# Altium footprint library Global Library.PcbLib: 82 footprints (part 2 of 6)
Each footprint in its own frame and in the unit in brackets; x right, y up, seen from the top. Pads: shape width x height; smd on the part's side, far side on the other; paste and mask are expansions set on the pad; w line width, h text height; cw(c..) or ccw(c..) is an arc to the next point about the centre after c.
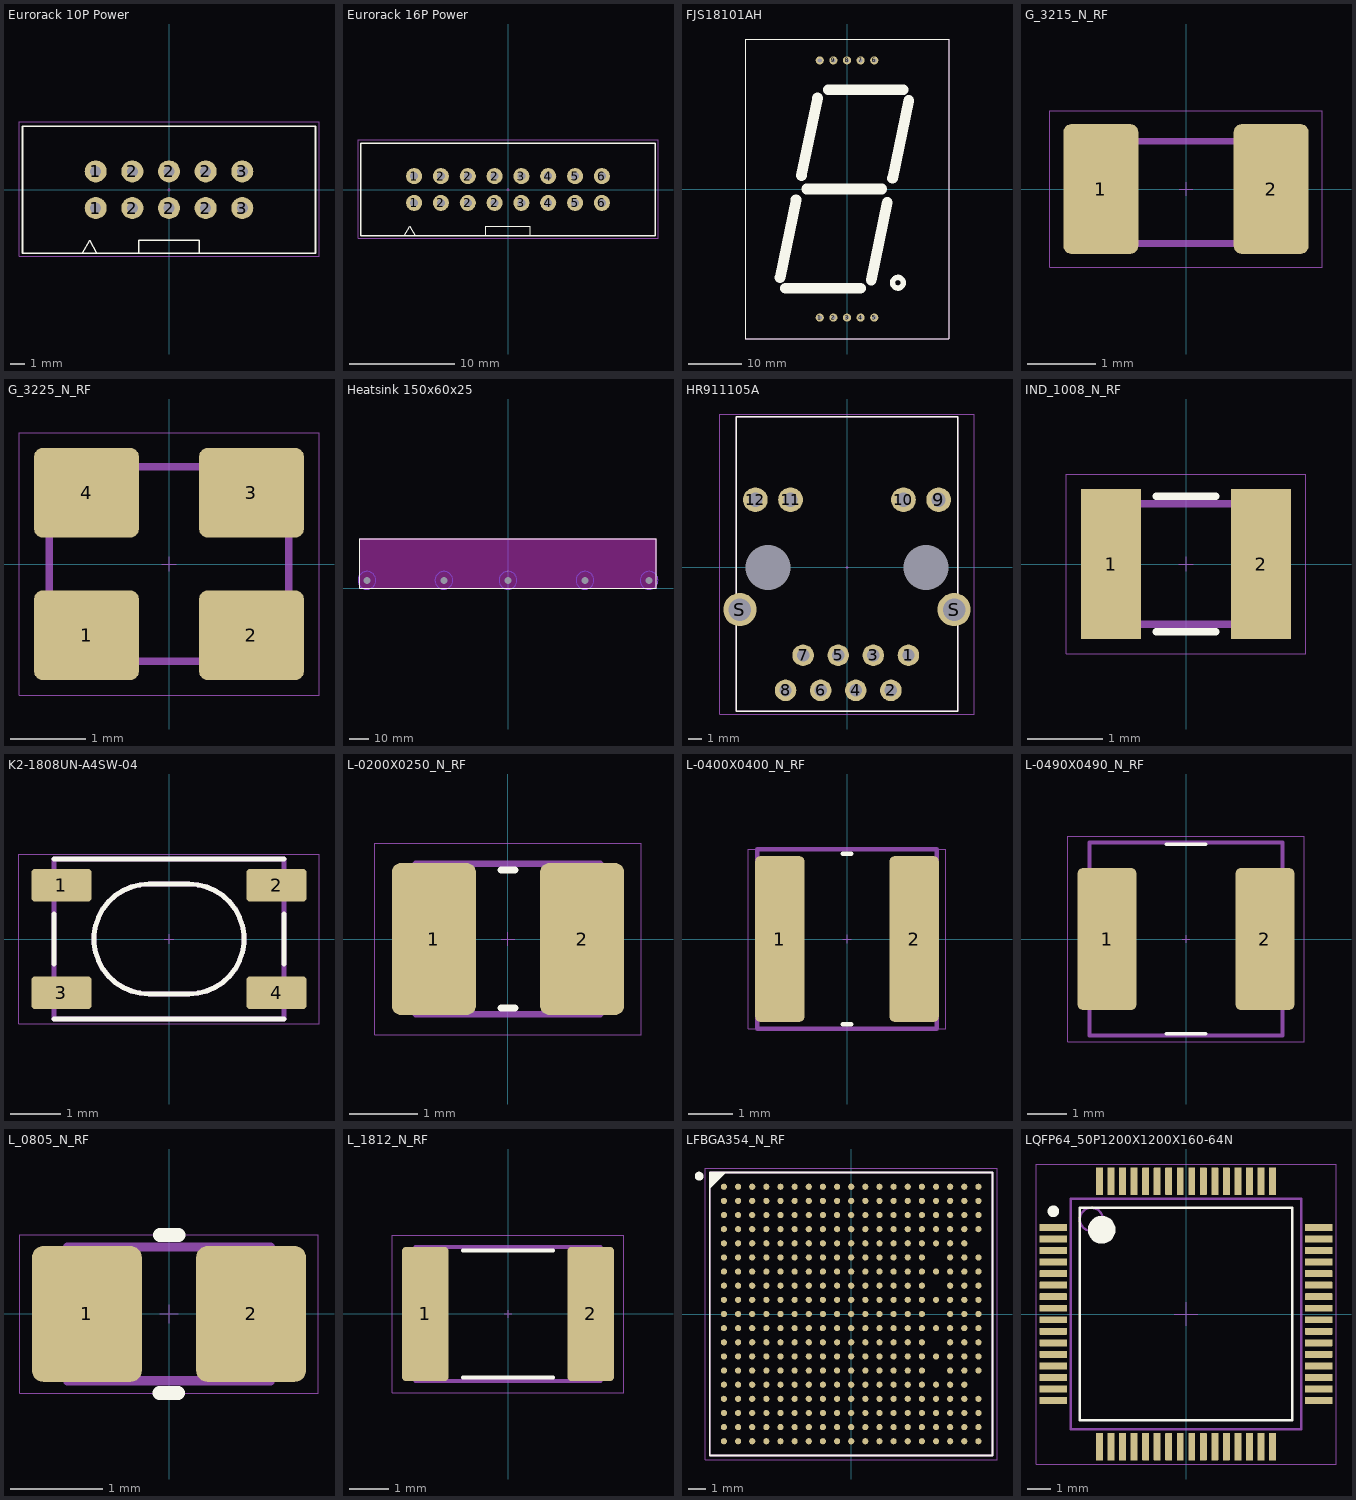
[diagram p1: the footprints below, top view; thin cyan lines are the x and y axes]

## Eurorack 10P Power [mil]
pads (10):
  round 60 hole 30: 1(-200,-50) 1(-200,50) 2(-100,-50) 2(-100,50) 2(0,-50) 2(0,50) 2(100,-50) 2(100,50) 3(200,-50) 3(200,50)
Top Overlay:
  lines w3.94: -236.22,-173.23 -216.54,-137.8 -196.85,-173.23 ; -82.3,-173.23 -82.3,-137.8 0,-137.8 82.3,-137.8 82.3,-173.23
  lines w5: -399.61,-173.23 -399.61,173.23 399.61,173.23 399.61,-173.23 -399.61,-173.23
Top Courtyard:
  lines w0.39: -3.94,0 3.94,0 ; 0,-3.94 0,3.94 ; -409.45,-181.1 -409.45,185.04 409.45,185.04 409.45,-181.1 -409.45,-181.1
Top Assy THT:
  text ".Designator" at -397.64,204.72 h39.37
3D body "User Library-DS1013-10S (IDC-10MS CONNFLY).step": height 354.33, standoff -141.73, extent -403.54,-177.17 403.54,173.23

## Eurorack 16P Power [mil]
pads (16):
  round 60 hole 30: 1(-350,-50) 1(-350,50) 2(-250,-50) 2(-250,50) 2(-150,-50) 2(-150,50) 2(-50,-50) 2(-50,50) 3(50,-50) 3(50,50) 4(150,-50) 4(150,50) 5(250,-50) 5(250,50) 6(350,-50) 6(350,50)
Top Overlay:
  lines w3.94: -386.22,-173.23 -366.54,-137.8 -346.85,-173.23 ; -82.3,-173.23 -82.3,-137.8 0,-137.8 82.3,-137.8 82.3,-173.23
  lines w5: -549.61,-173.23 -549.61,173.23 549.61,173.23 549.61,-173.23 -549.61,-173.23
Top Courtyard:
  lines w0.39: -3.94,0 3.94,0 ; 0,-3.94 0,3.94 ; -559.45,-181.1 -559.45,185.04 559.45,185.04 559.45,-181.1 -559.45,-181.1
Top Assy THT:
  text ".Designator" at -397.64,204.72 h39.37
3D body "30316-6002.stp": height 350, standoff -125, extent -549.21,-166.96 549.79,179.93

## FJS18101AH [mil]
pads (10):
  round 60 hole 30: 1(-200,-944.88) 2(-100,-944.88) 3(0,-944.88) 4(100,-944.88) 5(200,-944.88) 6(200,944.88) 7(100,944.88) 8(0,944.88) 9(-100,944.88) 10(-200,944.88)
Top Overlay:
  circle w39.37: c374.02,-688.98 r39.37
  lines w3.94: -748.03,-1102.36 -748.03,1102.36 748.03,1102.36 748.03,-1102.36 -748.03,-1102.36
  lines w78.74: -492.13,-649.61 -374.02,-78.74 ; -452.76,-728.35 98.43,-728.35 ; -334.65,98.43 -216.54,669.29 ; -295.28,0 255.91,0 ; -137.8,728.35 413.39,728.35 ; 177.17,-669.29 295.28,-98.43 ; 334.65,78.74 452.76,649.61
Top Courtyard:
  lines w0.39: -3.94,0 3.94,0 ; 0,-3.94 0,3.94 ; -748.03,-1102.36 -748.03,1102.36 748.03,1102.36 748.03,-1102.36 -748.03,-1102.36
Top Assembly:
  lines w3.94: -748.03,-1102.36 748.03,-1102.36 748.03,1102.36 -748.03,1102.36 -748.03,-1102.36
Top Assy SMT:
  lines w3.94: -748.03,-1102.36 748.03,-1102.36 748.03,1102.36 -748.03,1102.36 -748.03,-1102.36
Top Assy THT:
  text ".Designator" at -607.97,1018.85 h78.74

## G_3215_N_RF [mm] "Quarz Oscillator 2pin 3.2mm x 1.5mm"
height 0.8
pads (2):
  rrect20% 1.1x1.9 smd: 1(-1.25,0) 2(1.25,0)
Top Courtyard:
  lines w0.01: -0.1,0 0.1,0 ; 0,-0.1 0,0.1 ; -2,-1.15 -2,1.15 2,1.15 2,-1.15 -2,-1.15
Top Assembly:
  lines w0.1: -1.6,-0.8 1.6,-0.8 1.6,0.7 -1.6,0.7 -1.6,-0.8
Top Assy SMT:
  lines w0.1: -1.6,-0.8 1.6,-0.8 1.6,0.7 -1.6,0.7 -1.6,-0.8
  text ".Designator" at -2,1.3 h1
3D body "User Library-IL3X.step": height 0.9, standoff -0.01, extent -1.583,-0.757 1.617,0.743

## G_3225_N_RF [mm] "Crystal Oscillator  2.5mm X 3.2mm"
height 0.7
pads (4):
  rrect20% 1.4x1.2 smd: 1(-1.1,-0.95) 2(1.1,-0.95) 3(1.1,0.95) 4(-1.1,0.95)
Top Courtyard:
  lines w0.01: -0.1,0 0.1,0 ; 0,-0.1 0,0.1 ; -2,-1.75 -2,1.75 2,1.75 2,-1.75 -2,-1.75
Top Assembly:
  lines w0.1: -1.6,-1.3 1.6,-1.3 1.6,1.3 -1.6,1.3 -1.6,-1.3
Top Assy SMT:
  lines w0.1: -1.6,-1.3 1.6,-1.3 1.6,1.3 -1.6,1.3 -1.6,-1.3
  text ".Designator" at -1.7,1.8 h1
3D body "NX3225SA v2.step": height 0.55, standoff 0, extent -1.6,-1.25 1.6,1.25

## Heatsink 150x60x25 [mm]
pads (5):
  round 0 hole 3.5 unplated: 1(-71.261,4) 1(-32.391,4) 1(0,4) 1(38.87,4) 1(71.261,4)
Top Layer keep-out:
  region: -75,25 -75,0 75,0 75,25
Bottom Layer keep-out:
  circle w0.1: c71.261,4 r4.5
  circle w0.1: c38.87,4 r4.5
  circle w0.1: c-71.261,4 r4.5
  circle w0.1: c-32.391,4 r4.5
  circle w0.1: c0,4 r4.5
Top Overlay:
  lines w0.1: -75,0 75,0 75,25 -75,25 -75,0
Top Assembly:
  lines w0.1: -75,0 -75,25 75,25 75,0 -75,0
3D body "Kühlkörper.stp": height 60, standoff 0, extent -75,0 75,25

## HR911105A [mm] "Connector Ethernet 10/100Base-T"
pads (16):
  round 1.558 hole 0.89: 1(4.445,-6.35) 2(3.175,-8.89) 3(1.905,-6.35) 4(0.635,-8.89) 5(-0.635,-6.35) 6(-1.905,-8.89) 7(-3.175,-6.35) 8(-4.445,-8.89)
  round 1.785 hole 1.02: 9(6.625,4.9) 10(4.085,4.9) 11(-4.085,4.9) 12(-6.625,4.9)
  round 0 hole 3.25 unplated: 13(5.715,0) 14(-5.715,0)
  round 2.4 hole 1.63: S(-7.745,-3.05) S(7.745,-3.05)
Top Overlay:
  lines w0.1: -8,-10.4 8,-10.4 8,10.9 -8,10.9 -8,-10.4
Top Courtyard:
  lines w0.01: -0.1,0 0.1,0 ; 0,-0.1 0,0.1 ; -9.2,-10.6 9.2,-10.6 9.2,11.1 -9.2,11.1 -9.2,-10.6
Top Assy SMT:
  lines w0.1: -8,-10.4 -8,10.9 8,10.9 8,-10.4 -8,-10.4
Top Assy THT:
  text ".Designator" at 3.3,-11.3 h1
3D body "HR911105A--3DModel-STEP-56544.STEP": height 13.5, standoff -3.05, extent -8.02,-10.4 8.02,10.9

## IND_1008_N_RF [mm] "Inductor 2.5mmx2mm"
height 1.2
pads (2):
  rect 0.8x2 smd: 1(-1,0) 2(1,0)
Top Overlay:
  lines w0.1: -0.4,-0.9 0.4,-0.9 ; -0.4,0.9 0.4,0.9
Top Courtyard:
  lines w0.01: -0.1,0 0.1,0 ; 0,-0.1 0,0.1 ; -1.6,-1.2 1.6,-1.2 1.6,1.2 -1.6,1.2 -1.6,-1.2
Top Assembly:
  lines w0.1: -1.3,-0.8 -1.3,0.8 1.3,0.8 1.3,-0.8 -1.3,-0.8
Top Assy SMT:
  lines w0.1: -1.3,-0.8 1.3,-0.8 1.3,0.8 -1.3,0.8 -1.3,-0.8
  text ".Designator" at -1.7,1.4 h0.8
3D body "DFE252012P-R47M=P2.STEP": height 1.2, standoff 0, extent -1.25,-1 1.25,1

## K2-1808UN-A4SW-04 [mm]
pads (4):
  rrect20% 1.2x0.65 smd: 1(-2.15,1.075) 2(2.15,1.075) 3(-2.15,-1.075) 4(2.15,-1.075)
Top Overlay:
  lines w0.1: -2.3,-1.6 2.3,-1.6 ; -2.3,-0.5 -2.3,0.5 ; -2.3,1.6 2.3,1.6 ; 2.3,-0.5 2.3,0.5 ; -0.4,-1.1 cw(c-0.4,0) -0.4,1.1 0.4,1.1 cw(c0.4,0) 0.4,-1.1 -0.4,-1.1
Top Courtyard:
  lines w0.01: -0.1,0 0.1,0 ; 0,-0.1 0,0.1 ; -3,-1.7 -3,1.7 3,1.7 3,-1.7 -3,-1.7
Top Assembly:
  lines w0.1: -2.3,-1.6 -2.3,1.6 2.3,1.6 2.3,-1.6 -2.3,-1.6 ; -0.4,-1.1 cw(c-0.4,0) -0.4,1.1 0.4,1.1 cw(c0.4,0) 0.4,-1.1 -0.4,-1.1
Top Assy SMT:
  lines w0.1: -2.3,-1.6 -2.3,1.6 2.3,1.6 2.3,-1.6 -2.3,-1.6 ; -0.4,-1.1 cw(c-0.4,0) -0.4,1.1 0.4,1.1 cw(c0.4,0) 0.4,-1.1 -0.4,-1.1
  text ".Designator" at -2.3,1.8 h0.8
3D body "buttonK2-1808UN-A4SW-04.step": height 2.5, standoff 0, extent -2.35,-1.65 2.35,1.65

## L-0200X0250_N_RF [mm] "Chip Inductor, 2-Leads, Body 2.50x2.00mm, IPC Medium Density"
height 1.2
pads (2):
  rrect20% 1.23x2.22 smd: 1(-1.085,0) 2(1.085,0)
Top Overlay:
  lines w0.1: -0.1,-1.01 0.1,-1.01 ; -0.1,1.01 0.1,1.01
Top Courtyard:
  lines w0.01: -0.1,0 0.1,0 ; 0,-0.1 0,0.1 ; -1.95,-1.4 1.95,-1.4 1.95,1.4 -1.95,1.4 -1.95,-1.4
Top Assembly:
  lines w0.1: -1.35,-1.1 1.35,-1.1 1.35,1.1 -1.35,1.1 -1.35,-1.1
Top Assy SMT:
  lines w0.1: -1.35,-1.1 -1.35,1.1 1.35,1.1 1.35,-1.1 -1.35,-1.1
  text ".Designator" at -1.323,1.19 h1.2
3D body "L-0200X0250_N_RF.step": height 1.2, standoff 0, extent -1.35,-1.1 1.35,1.1

## L-0400X0400_N_RF [mm] "Chip Inductor, 2-Leads, Body 4.00x4.00mm, IPC Medium Density"
height 3
pads (2):
  rrect20% 1.1x3.7 smd: 1(-1.5,0) 2(1.5,0)
Top Overlay:
  lines w0.1: -0.1,-1.9 0.1,-1.9 ; -0.1,1.9 0.1,1.9
Top Courtyard:
  lines w0.01: -0.1,0 0.1,0 ; 0,-0.1 0,0.1 ; -2.2,-2 -2.2,2 2.2,2 2.2,-2 -2.2,-2
Top Assembly:
  lines w0.1: -2,-2 -2,2 2,2 2,-2 -2,-2
Top Assy SMT:
  lines w0.1: -2,-2 2,-2 2,2 -2,2 -2,-2
  text ".Designator" at -2,2.3 h1.2

## L-0490X0490_N_RF [mm] "Chip Inductor, 2-Leads, Body 4.90x4.90mm, IPC Medium Density"
height 4
pads (2):
  rrect20% 1.5x3.6 smd: 1(-2,0) 2(2,0)
Top Overlay:
  lines w0.1: -0.5,-2.4 0.5,-2.4 ; -0.5,2.4 0.5,2.4
Top Courtyard:
  lines w0.01: -0.1,0 0.1,0 ; 0,-0.1 0,0.1 ; -3,-2.6 -3,2.6 3,2.6 3,-2.6 -3,-2.6
Top Assembly:
  lines w0.1: -2.45,-2.45 -2.45,2.45 2.45,2.45 2.45,-2.45 -2.45,-2.45
Top Assy SMT:
  lines w0.1: -2.45,-2.45 2.45,-2.45 2.45,2.45 -2.45,2.45 -2.45,-2.45
  text ".Designator" at -2.5,2.8 h1.2

## L_0805_N_RF [mm]
pads (2):
  rrect20% 1.19x1.47 smd: 1(-0.89,0) 2(0.89,0)
Top Overlay:
  lines w0.15: -0.101,-0.857 0.099,-0.857 ; -0.099,0.857 0.101,0.857
Top Courtyard:
  lines w0.01: -0.1,0 0.1,0 ; 0,-0.1 0,0.1 ; -1.618,-0.858 1.615,-0.858 1.615,0.857 -1.618,0.857 -1.618,-0.858
Top Assembly:
  lines w0.1: -1.1,-0.725 1.1,-0.725 1.1,0.725 -1.1,0.725 -1.1,-0.725
Top Assy SMT:
  lines w0.1: -1.1,-0.725 1.1,-0.725 1.1,0.725 -1.1,0.725 -1.1,-0.725
  text ".Designator" at -1.1,1 h1
3D body "INDC0805X09L.step": height 0.9, standoff 0, extent -1.1,-0.725 1.1,0.725

## L_1812_N_RF [mm] "Chip Inductor, 2-Leads, Body 4.50x3.20mm, IPC Medium Density"
height 1.7
pads (2):
  rrect20% 1.19x3.42 smd: 1(-2.105,0) 2(2.105,0)
Top Overlay:
  lines w0.1: -1.15,-1.61 1.15,-1.61 ; -1.15,1.61 1.15,1.61
Top Courtyard:
  lines w0.01: -0.1,0 0.1,0 ; 0,-0.1 0,0.1 ; -2.95,-2 2.95,-2 2.95,2 -2.95,2 -2.95,-2
Top Assembly:
  lines w0.1: -2.35,-1.7 2.35,-1.7 2.35,1.7 -2.35,1.7 -2.35,-1.7
Top Assy SMT:
  lines w0.1: -2.35,-1.7 2.35,-1.7 2.35,1.7 -2.35,1.7 -2.35,-1.7
  text ".Designator" at -2.6,2.1 h1
3D body "L_1812_N_RF.step": height 1.7, standoff 0, extent -2.35,-1.7 2.35,1.7

## LFBGA354_N_RF [mm] "BGA, 354-Leads, Body 16.00x16.00mmx1.29mm, Pitch 0.80mm"
height 1.29
pads (354):
  round 0.35 smd: A1(-7.2,7.2) A2(-6.4,7.2) A3(-5.6,7.2) A4(-4.8,7.2) A5(-4,7.2) A6(-3.2,7.2) A7(-2.4,7.2) A8(-1.6,7.2) A9(-0.8,7.2) A10(0,7.2) A11(0.8,7.2) A12(1.6,7.2) A13(2.4,7.2) A14(3.2,7.2) A15(4,7.2) A16(4.8,7.2) A17(5.6,7.2) A18(6.4,7.2) A19(7.2,7.2) B1(-7.2,6.4) B2(-6.4,6.4) B3(-5.6,6.4) B4(-4.8,6.4) B5(-4,6.4) B6(-3.2,6.4) B7(-2.4,6.4) B8(-1.6,6.4) B9(-0.8,6.4) B10(0,6.4) B11(0.8,6.4) B12(1.6,6.4) B13(2.4,6.4) B14(3.2,6.4) B15(4,6.4) B16(4.8,6.4) B17(5.6,6.4) B18(6.4,6.4) B19(7.2,6.4) C1(-7.2,5.6) C2(-6.4,5.6) C3(-5.6,5.6) C4(-4.8,5.6) C5(-4,5.6) C6(-3.2,5.6) C7(-2.4,5.6) C8(-1.6,5.6) C9(-0.8,5.6) C10(0,5.6) C11(0.8,5.6) C12(1.6,5.6) C13(2.4,5.6) C14(3.2,5.6) C15(4,5.6) C16(4.8,5.6) C17(5.6,5.6) C18(6.4,5.6) C19(7.2,5.6) D1(-7.2,4.8) D2(-6.4,4.8) D3(-5.6,4.8) D4(-4.8,4.8) D5(-4,4.8) D6(-3.2,4.8) D7(-2.4,4.8) D8(-1.6,4.8) D9(-0.8,4.8) D10(0,4.8) D11(0.8,4.8) D12(1.6,4.8) D13(2.4,4.8) D14(3.2,4.8) D15(4,4.8) D16(4.8,4.8) D17(5.6,4.8) D18(6.4,4.8) D19(7.2,4.8) E1(-7.2,4) E2(-6.4,4) E3(-5.6,4) E4(-4.8,4) E5(-4,4) E6(-3.2,4) E7(-2.4,4) E8(-1.6,4) E9(-0.8,4) E10(0,4) E11(0.8,4) E12(1.6,4) E13(2.4,4) E14(3.2,4) E15(4,4) E16(4.8,4) E17(5.6,4) E18(6.4,4) F1(-7.2,3.2) F2(-6.4,3.2) F3(-5.6,3.2) F4(-4.8,3.2) F5(-4,3.2) F6(-3.2,3.2) F7(-2.4,3.2) F8(-1.6,3.2) F9(-0.8,3.2) F10(0,3.2) F11(0.8,3.2) F12(1.6,3.2) F13(2.4,3.2) F14(3.2,3.2) F15(4,3.2) F17(5.6,3.2) F18(6.4,3.2) F19(7.2,3.2) G1(-7.2,2.4) G2(-6.4,2.4) G3(-5.6,2.4) G4(-4.8,2.4) G5(-4,2.4) G6(-3.2,2.4) G7(-2.4,2.4) G8(-1.6,2.4) G9(-0.8,2.4) G10(0,2.4) G11(0.8,2.4) G12(1.6,2.4) G13(2.4,2.4) G14(3.2,2.4) G15(4,2.4) G16(4.8,2.4) G17(5.6,2.4) G18(6.4,2.4) G19(7.2,2.4) H1(-7.2,1.6) H2(-6.4,1.6) H3(-5.6,1.6) H4(-4.8,1.6) H5(-4,1.6) H6(-3.2,1.6) H7(-2.4,1.6) H8(-1.6,1.6) H9(-0.8,1.6) H10(0,1.6) H11(0.8,1.6) H12(1.6,1.6) H13(2.4,1.6) H14(3.2,1.6) H15(4,1.6) H17(5.6,1.6) H18(6.4,1.6) H19(7.2,1.6) J1(-7.2,0.8) J2(-6.4,0.8) J3(-5.6,0.8) J4(-4.8,0.8) J5(-4,0.8) J6(-3.2,0.8) J7(-2.4,0.8) J8(-1.6,0.8) J9(-0.8,0.8) J10(0,0.8) J11(0.8,0.8) J12(1.6,0.8) J13(2.4,0.8) J14(3.2,0.8) J15(4,0.8) J16(4.8,0.8) J17(5.6,0.8) J18(6.4,0.8) J19(7.2,0.8) K1(-7.2,0) K2(-6.4,0) K3(-5.6,0) K4(-4.8,0) K5(-4,0) K6(-3.2,0) K7(-2.4,0) K8(-1.6,0) K9(-0.8,0) K10(0,0) K11(0.8,0) K12(1.6,0) K13(2.4,0) K14(3.2,0) K15(4,0) K17(5.6,0) K18(6.4,0) K19(7.2,0) L1(-7.2,-0.8) L2(-6.4,-0.8) L3(-5.6,-0.8) L4(-4.8,-0.8) L5(-4,-0.8) L6(-3.2,-0.8) L7(-2.4,-0.8) L8(-1.6,-0.8) L9(-0.8,-0.8) L10(0,-0.8) L11(0.8,-0.8) L12(1.6,-0.8) L13(2.4,-0.8) L14(3.2,-0.8) L15(4,-0.8) L16(4.8,-0.8) L17(5.6,-0.8) L18(6.4,-0.8) L19(7.2,-0.8) M1(-7.2,-1.6) M2(-6.4,-1.6) M3(-5.6,-1.6) M4(-4.8,-1.6) M5(-4,-1.6) M6(-3.2,-1.6) M7(-2.4,-1.6) M8(-1.6,-1.6) M9(-0.8,-1.6) M10(0,-1.6) M11(0.8,-1.6) M12(1.6,-1.6) M13(2.4,-1.6) M14(3.2,-1.6) M15(4,-1.6) M17(5.6,-1.6) M18(6.4,-1.6) M19(7.2,-1.6) N1(-7.2,-2.4) N2(-6.4,-2.4) N3(-5.6,-2.4) N4(-4.8,-2.4) N5(-4,-2.4) N6(-3.2,-2.4) N7(-2.4,-2.4) N8(-1.6,-2.4) N9(-0.8,-2.4) N10(0,-2.4) N11(0.8,-2.4) N12(1.6,-2.4) N13(2.4,-2.4) N14(3.2,-2.4) N15(4,-2.4) N16(4.8,-2.4) N17(5.6,-2.4) N18(6.4,-2.4) N19(7.2,-2.4) P1(-7.2,-3.2) P2(-6.4,-3.2) P3(-5.6,-3.2) P4(-4.8,-3.2) P5(-4,-3.2) P6(-3.2,-3.2) P7(-2.4,-3.2) P8(-1.6,-3.2) P9(-0.8,-3.2) P10(0,-3.2) P11(0.8,-3.2) P12(1.6,-3.2) P13(2.4,-3.2) P14(3.2,-3.2) P15(4,-3.2) P17(5.6,-3.2) P18(6.4,-3.2) P19(7.2,-3.2) R1(-7.2,-4) R2(-6.4,-4) R3(-5.6,-4) R4(-4.8,-4) R5(-4,-4) R6(-3.2,-4) R7(-2.4,-4) R8(-1.6,-4) R9(-0.8,-4) R10(0,-4) R11(0.8,-4) R12(1.6,-4) R13(2.4,-4) R14(3.2,-4) R15(4,-4) R16(4.8,-4) R17(5.6,-4) R18(6.4,-4) T1(-7.2,-4.8) T2(-6.4,-4.8) T3(-5.6,-4.8) T4(-4.8,-4.8) T5(-4,-4.8) T6(-3.2,-4.8) T7(-2.4,-4.8) T8(-1.6,-4.8) T9(-0.8,-4.8) T10(0,-4.8) T11(0.8,-4.8) T12(1.6,-4.8) T13(2.4,-4.8) T14(3.2,-4.8) T15(4,-4.8) T16(4.8,-4.8) T17(5.6,-4.8) T18(6.4,-4.8) T19(7.2,-4.8) U1(-7.2,-5.6) U2(-6.4,-5.6) U3(-5.6,-5.6) U4(-4.8,-5.6) U5(-4,-5.6) U6(-3.2,-5.6) U7(-2.4,-5.6) U8(-1.6,-5.6) U9(-0.8,-5.6) U10(0,-5.6) U11(0.8,-5.6) U12(1.6,-5.6) U13(2.4,-5.6) U14(3.2,-5.6) U15(4,-5.6) U16(4.8,-5.6) U17(5.6,-5.6) U18(6.4,-5.6) U19(7.2,-5.6) V1(-7.2,-6.4) V2(-6.4,-6.4) V3(-5.6,-6.4) V4(-4.8,-6.4) V5(-4,-6.4) V6(-3.2,-6.4) V7(-2.4,-6.4) V8(-1.6,-6.4) V9(-0.8,-6.4) V10(0,-6.4) V11(0.8,-6.4) V12(1.6,-6.4) V13(2.4,-6.4) V14(3.2,-6.4) V15(4,-6.4) V16(4.8,-6.4) V17(5.6,-6.4) V18(6.4,-6.4) V19(7.2,-6.4) W1(-7.2,-7.2) W2(-6.4,-7.2) W3(-5.6,-7.2) W4(-4.8,-7.2) W5(-4,-7.2) W6(-3.2,-7.2) W7(-2.4,-7.2) W8(-1.6,-7.2) W9(-0.8,-7.2) W10(0,-7.2) W11(0.8,-7.2) W12(1.6,-7.2) W13(2.4,-7.2) W14(3.2,-7.2) W15(4,-7.2) W16(4.8,-7.2) W17(5.6,-7.2) W18(6.4,-7.2) W19(7.2,-7.2)
Top Overlay:
  circle w0.25: c-8.6,7.8 r0.125
  region: -7.142,8 -8,7.142 -8,8
  lines w0.1: -8,7.142 -7.142,8 ; -8,-8 -8,8 8,8 8,-8 -8,-8
Top Courtyard:
  lines w0.01: -0.1,0 0.1,0 ; 0,-0.1 0,0.1 ; -8.25,-8.25 -8.25,8.25 8.25,8.25 8.25,-8.25 -8.25,-8.25
Top Assembly:
  lines w0.1: -8,-8 -8,8 8,8 8,-8 -8,-8
Top Assy SMT:
  text ".Designator" at -8.1,8.4 h1
3D body "LFBGA354_N_RF.step": height 1.29, standoff 0, extent -8,-8 8,8

## LQFP64_50P1200X1200X160-64N [mm] "LQFP, 64-Leads, Body 10.00x10.00mm, Pitch 0.50mm, IPC Medium Density"
height 1.6
pads (64):
  rrect20% 1.2x0.3 smd: 1(-5.75,3.75) 2(-5.75,3.25) 3(-5.75,2.75) 4(-5.75,2.25) 5(-5.75,1.75) 6(-5.75,1.25) 7(-5.75,0.75) 8(-5.75,0.25) 9(-5.75,-0.25) 10(-5.75,-0.75) 11(-5.75,-1.25) 12(-5.75,-1.75) 13(-5.75,-2.25) 14(-5.75,-2.75) 15(-5.75,-3.25) 16(-5.75,-3.75) 33(5.75,-3.75) 34(5.75,-3.25) 35(5.75,-2.75) 36(5.75,-2.25) 37(5.75,-1.75) 38(5.75,-1.25) 39(5.75,-0.75) 40(5.75,-0.25) 41(5.75,0.25) 42(5.75,0.75) 43(5.75,1.25) 44(5.75,1.75) 45(5.75,2.25) 46(5.75,2.75) 47(5.75,3.25) 48(5.75,3.75)
  rrect20% 0.3x1.2 smd: 17(-3.75,-5.75) 18(-3.25,-5.75) 19(-2.75,-5.75) 20(-2.25,-5.75) 21(-1.75,-5.75) 22(-1.25,-5.75) 23(-0.75,-5.75) 24(-0.25,-5.75) 25(0.25,-5.75) 26(0.75,-5.75) 27(1.25,-5.75) 28(1.75,-5.75) 29(2.25,-5.75) 30(2.75,-5.75) 31(3.25,-5.75) 32(3.75,-5.75) 49(3.75,5.75) 50(3.25,5.75) 51(2.75,5.75) 52(2.25,5.75) 53(1.75,5.75) 54(1.25,5.75) 55(0.75,5.75) 56(0.25,5.75) 57(-0.25,5.75) 58(-0.75,5.75) 59(-1.25,5.75) 60(-1.75,5.75) 61(-2.25,5.75) 62(-2.75,5.75) 63(-3.25,5.75) 64(-3.75,5.75)
Top Overlay:
  circle w0.25: c-5.75,4.45 r0.125
  circle w0.6: c-3.65,3.65 r0.3
  lines w0.1: -4.6,-4.6 -4.6,4.6 4.6,4.6 4.6,-4.6 -4.6,-4.6
Top Courtyard:
  lines w0.01: -0.5,0 0.5,0 ; 0,-0.5 0,0.5 ; -6.5,-6.5 -6.5,6.5 6.5,6.5 6.5,-6.5 -6.5,-6.5
Top Assembly:
  circle w0.1: c-4.1,4.1 r0.5
  lines w0.1: -5,-5 -5,5 5,5 5,-5 -5,-5
Top Assy SMT:
  circle w0.1: c-4.1,4.1 r0.5
  lines w0.1: -5,-5 -5,5 5,5 5,-5 -5,-5
  text ".Designator" at -2.413,-0.221 h1
3D body "LQFP-64.step": height 1.6, standoff 0, extent -6.007,-6.007 6.007,6.007